# Altium footprint library common_pcblib.PcbLib: 54 footprints (part 4 of 4)
Each footprint in its own frame and in the unit in brackets; x right, y up, seen from the top. Pads: shape width x height; smd on the part's side, far side on the other; paste and mask are expansions set on the pad; w line width, h text height; cw(c..) or ccw(c..) is an arc to the next point about the centre after c.
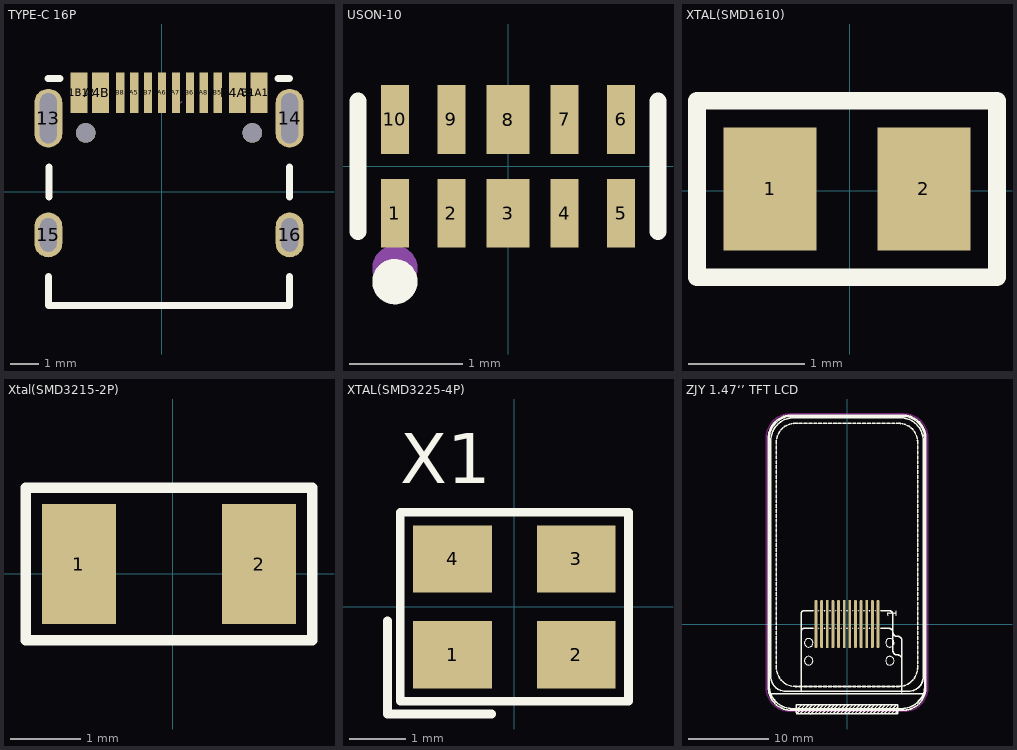
[diagram p3: the footprints below, top view; thin cyan lines are the x and y axes]

## TYPE-C 16P [mm]
pads (18):
  oval 1x2.1 hole 0.6 slot 1.8 at 90 deg: 13(-4.062,2.641) 14(4.578,2.641)
  oval 1x1.6 hole 0.6 slot 1.2 at 90 deg: 15(-4.062,-1.539) 16(4.578,-1.539)
  rect 0.6x1.45 smd: A1B12(-2.967,3.556) A4B9(-2.192,3.556) B1A12(3.478,3.556) B4A9(2.708,3.556)
  rect 0.3x1.45 smd: A5(-0.992,3.555) A6(0.008,3.556) A7(0.508,3.556) A8(1.508,3.556) B5(2.008,3.556) B6(1.008,3.556) B7(-0.492,3.556) B8(-1.492,3.556)
  round 0.7 hole 0.7 unplated: ""(-2.722,2.111) ""(3.238,2.111)
Top Overlay:
  lines w0.254: -4.064,4.064 -3.654,4.064 ; -4.06,-3.023 -4.06,-4.071 4.576,-4.071 4.576,-3.023 ; -4.039,-0.178 -4.039,0.889 ; 4.166,4.057 4.576,4.057 ; 4.576,-0.178 4.576,0.889
Mechanical 15:
  lines w0.003: 0.686,3.198 0.737,3.249
3D body "User Library-USB Type C Port (SMD Type).step": height 3.26, standoff -0.94, extent -4.216,-4.191 4.724,3.709

## USON-10 [mm] "ESD二极管保护阵列用"
pads (10):
  rect 0.25x0.609 smd: 1(-1,-0.415) 2(-0.5,-0.415) 4(0.5,-0.415) 5(1,-0.415) 6(1,0.415) 7(0.5,0.415) 9(-0.5,0.415) 10(-1,0.415)
  rect 0.38x0.609 smd: 3(0,-0.415) 8(0,0.414)
Top Overlay:
  circle w0.2: c-1,-1.019 r0.1
  lines w0.152: -1.326,-0.576 -1.326,0.576 ; 1.326,-0.576 1.326,0.576
Mechanical 15:
  circle w0.2: c-1,-0.9 r0.1
3D body "User Library-UDFN10(USON-10).STEP": height 0.53, standoff -0.02, extent -1.25,-0.508 1.25,0.502

## XTAL(SMD1610) [mm]
pads (2):
  rect 0.8x1.06 smd: 1(-0.682,0.014) 2(0.638,0.014)
Top Overlay:
  lines w0.152: -1.31,-0.745 -1.31,0.772 1.267,0.772 1.267,-0.745 -1.31,-0.745
3D body "crystal_rtf1610.stp": height 0.5, standoff -0.01, extent -0.825,-0.492 0.775,0.508

## Xtal(SMD3215-2P) [mm]
pads (2):
  rect 1.05x1.7 smd: 1(-1.329,0.139) 2(1.221,0.139)
Top Overlay:
  lines w0.152: -2.083,-0.94 -2.083,1.217 1.974,1.217 1.974,-0.94 -2.083,-0.94
Mechanical 15:
  lines w0.003: 1,0.24 1.051,0.291
3D body "crystal_rtf3215.stp": height 0.9, standoff -0.01, extent -1.651,-0.598 1.549,0.902

## XTAL(SMD3225-4P) [mm]
pads (4):
  rect 1.4x1.2 smd: 1(-1.1,-0.85) 2(1.1,-0.85) 3(1.1,0.85) 4(-1.1,0.85)
Top Overlay:
  lines w0.152: -2.257,-0.25 -2.257,-1.907 -0.4,-1.907 ; -2.029,-1.679 -2.029,1.679 2.029,1.679 2.029,-1.679 -2.029,-1.679
  text "X1" at -2.032,1.905 h1.52
Mechanical 15:
  circle w0.36: c-1.143,-0.889 r0.18
3D body "User Library-3225-1.step": height 0.61, standoff 0, extent -1.6,-1.27 1.6,1.23

## ZJY 1.47‘’ TFT LCD [mm] "中景园1.47寸屏幕"
pads (12):
  oval 0.35x6 smd: 1(3.85,0) 2(3.15,0) 3(2.45,0) 4(1.75,0) 5(1.05,0) 6(0.35,0) 7(-0.35,0) 8(-1.05,0) 9(-1.75,0) 10(-2.45,0) 11(-3.15,0) 12(-3.85,0)
Top Overlay:
  drawing of 542 lines, arcs and shapes, not listed
  text "1" at 6.6,0.775 h2.03
Keep-Out Layer:
  lines w0.203: 7.1,26.075 cw(c7.1,23.175) 10,23.175 10,-7.925 cw(c7.1,-7.925) 7.1,-10.825 -7.1,-10.825 cw(c-7.1,-7.925) -10,-7.925 -10,23.175 cw(c-7.1,23.175) -7.1,26.075 7.1,26.075
3D body "未命名.stp": height 1.56, standoff 0, extent -9.613,-10.527 9.777,25.755